# Altium footprint library Universal components.PcbLib: 101 footprints (part 2 of 7)
Each footprint in its own frame and in the unit in brackets; x right, y up, seen from the top. Pads: shape width x height; smd on the part's side, far side on the other; paste and mask are expansions set on the pad; w line width, h text height; cw(c..) or ccw(c..) is an arc to the next point about the centre after c.
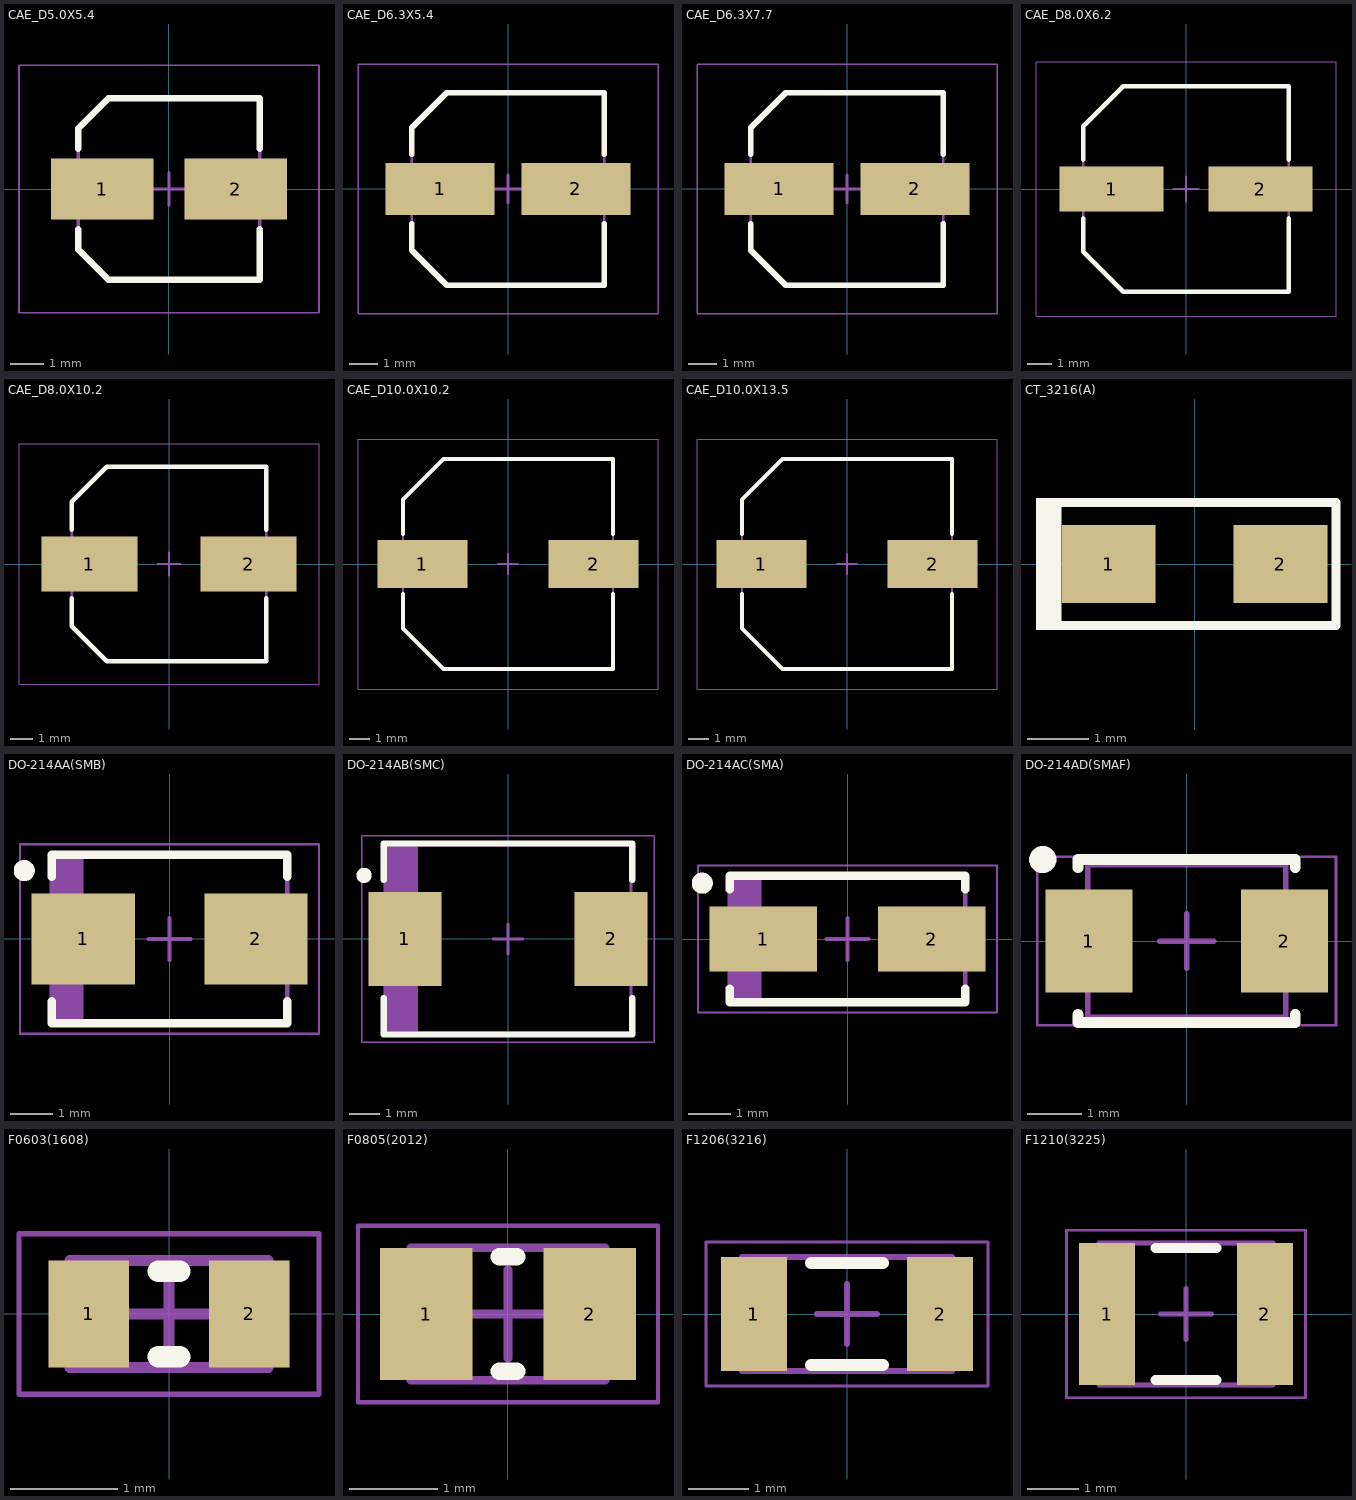
[diagram p1: the footprints below, top view; thin cyan lines are the x and y axes]

## CAE_D5.0X5.4 [mm] "Aluminum Electrolytic Capacitor, Body 5.30x5.30x5.60mm, IPC Low Density"
height 5.6
pads (2):
  rect 3.1x1.85 smd: 1(-2.025,0) 2(2.025,0)
Top Overlay:
  lines w0.2: -2.75,-1.225 -2.75,-1.837 -1.837,-2.75 2.75,-2.75 2.75,-1.225 ; -2.75,1.225 -2.75,1.837 -1.837,2.75 2.75,2.75 2.75,1.225
Mechanical 13:
  lines w0.1: -2.75,-1.837 -2.75,1.837 -1.837,2.75 2.75,2.75 2.75,-2.75 -1.837,-2.75 -2.75,-1.837
Mechanical 15:
  lines w0.05: -4.55,-3.75 4.55,-3.75 4.55,3.75 -4.55,3.75 -4.55,-3.75
  lines w0.1: -0.5,0 0.5,0 ; 0,-0.5 0,0.5
3D body "CAPAE-D5.0x5.4.stp": height 5.5, standoff 0, extent -3.25,-2.75 3.25,2.75

## CAE_D6.3X5.4 [mm] "Aluminum Electrolytic Capacitor, Body 6.60x6.60x5.70mm, IPC Low Density"
height 5.7
pads (2):
  rect 3.85x1.85 smd: 1(-2.4,0) 2(2.4,0)
Top Overlay:
  lines w0.2: -3.4,-1.225 -3.4,-2.163 -2.163,-3.4 3.4,-3.4 3.4,-1.225 ; -3.4,1.225 -3.4,2.163 -2.163,3.4 3.4,3.4 3.4,1.225
Mechanical 13:
  lines w0.1: -3.4,-2.163 -3.4,2.163 -2.163,3.4 3.4,3.4 3.4,-3.4 -2.163,-3.4 -3.4,-2.163
Mechanical 15:
  lines w0.05: -5.3,-4.4 5.3,-4.4 5.3,4.4 -5.3,4.4 -5.3,-4.4
  lines w0.1: -0.5,0 0.5,0 ; 0,-0.5 0,0.5
3D body "CAPAE-D6.3x5.4.stp": height 5.5, standoff 0, extent -3.9,-3.4 3.9,3.4

## CAE_D6.3X7.7 [mm] "Aluminum Electrolytic Capacitor, Body 6.60x6.60x7.90mm, IPC Low Density"
height 7.9
pads (2):
  rect 3.85x1.85 smd: 1(-2.4,0) 2(2.4,0)
Top Overlay:
  lines w0.2: -3.4,-1.225 -3.4,-2.163 -2.163,-3.4 3.4,-3.4 3.4,-1.225 ; -3.4,1.225 -3.4,2.163 -2.163,3.4 3.4,3.4 3.4,1.225
Mechanical 13:
  lines w0.1: -3.4,-2.163 -3.4,2.163 -2.163,3.4 3.4,3.4 3.4,-3.4 -2.163,-3.4 -3.4,-2.163
Mechanical 15:
  lines w0.05: -5.3,-4.4 5.3,-4.4 5.3,4.4 -5.3,4.4 -5.3,-4.4
  lines w0.1: -0.5,0 0.5,0 ; 0,-0.5 0,0.5
3D body "User Library-CC0607 D6.3X7.7.step": height 8.11, standoff 0, extent -3.5,-3.3 3.5,3.3

## CAE_D8.0X6.2 [mm] "Aluminum Electrolytic Capacitor, Body 8.30x8.30x6.40mm, IPC Low Density"
height 6.4
pads (2):
  rect 4.3x1.85 smd: 1(-3.075,0) 2(3.075,0)
Top Overlay:
  lines w0.2: -4.25,-1.225 -4.25,-2.588 -2.588,-4.25 4.25,-4.25 4.25,-1.225 ; -4.25,1.225 -4.25,2.588 -2.588,4.25 4.25,4.25 4.25,1.225
Mechanical 13:
  lines w0.1: -4.25,-2.588 -2.588,-4.25 4.25,-4.25 4.25,4.25 -2.588,4.25 -4.25,2.588 -4.25,-2.588
Mechanical 15:
  lines w0.05: -6.2,-5.25 -6.2,5.25 6.2,5.25 6.2,-5.25 -6.2,-5.25
  lines w0.1: -0.5,0 0.5,0 ; 0,-0.5 0,0.5
3D body "CAPAE-D8.0x6.2.stp": height 6.5, standoff 0, extent -4.75,-4.25 4.75,4.25

## CAE_D8.0X10.2 [mm] "Aluminum Electrolytic Capacitor, Body 8.30x8.30x11.00mm, IPC Low Density"
height 11
pads (2):
  rect 4.2x2.4 smd: 1(-3.475,0) 2(3.475,0)
Top Overlay:
  lines w0.2: -4.25,-1.5 -4.25,-2.725 -2.725,-4.25 4.25,-4.25 4.25,-1.5 ; -4.25,1.5 -4.25,2.725 -2.725,4.25 4.25,4.25 4.25,1.5
Mechanical 13:
  lines w0.1: -4.25,-2.725 -2.725,-4.25 4.25,-4.25 4.25,4.25 -2.725,4.25 -4.25,2.725 -4.25,-2.725
Mechanical 15:
  lines w0.05: -6.55,-5.25 -6.55,5.25 6.55,5.25 6.55,-5.25 -6.55,-5.25
  lines w0.1: -0.5,0 0.5,0 ; 0,-0.5 0,0.5
3D body "CAPAE-D8.0x10.2.stp": height 10.5, standoff 0, extent -5,-4.25 5,4.25

## CAE_D10.0X10.2 [mm] "Aluminum Electrolytic Capacitor, Body 10.30x10.30x11.00mm, IPC Low Density"
height 11
pads (2):
  rect 4.5x2.4 smd: 1(-4.275,0) 2(4.275,0)
Top Overlay:
  lines w0.2: -5.25,-1.5 -5.25,-3.225 -3.225,-5.25 5.25,-5.25 5.25,-1.5 ; -5.25,1.5 -5.25,3.225 -3.225,5.25 5.25,5.25 5.25,1.5
Mechanical 13:
  lines w0.1: -5.25,-3.225 -5.25,3.225 -3.225,5.25 5.25,5.25 5.25,-5.25 -3.225,-5.25 -5.25,-3.225
Mechanical 15:
  lines w0.05: -7.5,-6.25 7.5,-6.25 7.5,6.25 -7.5,6.25 -7.5,-6.25
  lines w0.1: -0.5,0 0.5,0 ; 0,-0.5 0,0.5
3D body "CAPAE-D10.0x10.2.stp": height 10.5, standoff 0, extent -6,-5.25 6,5.25

## CAE_D10.0X13.5 [mm] "Aluminum Electrolytic Capacitor, Body 10.30x10.30x14.50mm, IPC Low Density"
height 14.5
pads (2):
  rect 4.5x2.4 smd: 1(-4.275,0) 2(4.275,0)
Top Overlay:
  lines w0.2: -5.25,-1.5 -5.25,-3.225 -3.225,-5.25 5.25,-5.25 5.25,-1.5 ; -5.25,1.5 -5.25,3.225 -3.225,5.25 5.25,5.25 5.25,1.5
Mechanical 13:
  lines w0.1: -5.25,-3.225 -3.225,-5.25 5.25,-5.25 5.25,5.25 -3.225,5.25 -5.25,3.225 -5.25,-3.225
Mechanical 15:
  lines w0.05: -7.5,-6.25 -7.5,6.25 7.5,6.25 7.5,-6.25 -7.5,-6.25
  lines w0.1: -0.5,0 0.5,0 ; 0,-0.5 0,0.5
3D body "User Library-CL_series_size10x13,5.step": height 13.5, standoff 0, extent -5.45,-5.15 5.45,5.15

## CT_3216(A) [mil]
pads (2):
  rect 60x50 smd: 1(-55,0) 2(55,0)
Top Overlay:
  region: -85.11,42.32 -101.57,42.32 -101.57,-42.32 -85.11,-42.32
  lines w5.91: -90.55,-39.37 90.55,-39.37 90.55,39.37 -90.55,39.37
3D body "User Library-CAP_TANT_3216-18_A_case.SLDPRT": height 70.87, standoff 0, extent -66.93,-35.43 66.93,35.43

## DO-214AA(SMB) [mm] "Molded Diode, 2-Leads, Body 5.29x3.62mm, IPC Medium Density"
height 2.5
pads (2):
  rect 2.45x2.15 smd: 1(-2.05,0) 2(2.05,0)
Top Overlay:
  circle w0.25: c-3.45,1.625 r0.125
  lines w0.2: -2.8,-1.475 -2.8,-2 2.8,-2 2.8,-1.475 ; -2.8,1.475 -2.8,2 2.8,2 2.8,1.475
Mechanical 13:
  rectangle: -2.795,-1.97 -2.043,1.97
  lines w0.1: -2.795,-1.97 2.795,-1.97 2.795,1.97 -2.795,1.97 -2.795,-1.97
Mechanical 15:
  lines w0.05: -3.55,-2.25 3.55,-2.25 3.55,2.25 -3.55,2.25 -3.55,-2.25
  lines w0.1: -0.5,0 0.5,0 ; 0,-0.5 0,0.5
3D body "User Library-DIOM5539X24.step": height 2.45, standoff 0.03, extent -2.75,-1.95 2.75,1.95

## DO-214AB(SMC) [mm] "Molded Diode, 2-Leads, Body 7.94x5.90mm, IPC Medium Density"
height 2.5
pads (2):
  rect 2.4x3.1 smd: 1(-3.4,0) 2(3.4,0)
Top Overlay:
  circle w0.25: c-4.75,2.1 r0.125
  lines w0.2: -4.1,-1.95 -4.1,-3.15 4.1,-3.15 4.1,-1.95 ; -4.1,1.95 -4.1,3.15 4.1,3.15 4.1,1.95
Mechanical 13:
  rectangle: -4.065,-3.11 -2.972,3.11
  lines w0.1: -4.065,-3.11 4.065,-3.11 4.065,3.11 -4.065,3.11 -4.065,-3.11
Mechanical 15:
  lines w0.05: -4.825,-3.4 4.825,-3.4 4.825,3.4 -4.825,3.4 -4.825,-3.4
  lines w0.1: -0.5,0 0.5,0 ; 0,-0.5 0,0.5
3D body "User Library-DIOM8261X24.step": height 2.4, standoff 0.03, extent -4.065,-3.05 4.065,3.05

## DO-214AC(SMA) [mm] "Molded Diode, 2-Leads, Body 5.19x2.60mm, IPC Medium Density"
height 2.3
pads (2):
  rect 2.55x1.55 smd: 1(-2,0) 2(2,0)
Top Overlay:
  circle w0.25: c-3.45,1.325 r0.125
  lines w0.2: -2.8,-1.175 -2.8,-1.5 2.8,-1.5 2.8,-1.175 ; -2.8,1.175 -2.8,1.5 2.8,1.5 2.8,1.175
Mechanical 13:
  rectangle: -2.795,-1.46 -2.043,1.46
  lines w0.1: -2.795,-1.46 -2.795,1.46 2.795,1.46 2.795,-1.46 -2.795,-1.46
Mechanical 15:
  lines w0.05: -3.55,-1.75 -3.55,1.75 3.55,1.75 3.55,-1.75 -3.55,-1.75
  lines w0.1: -0.5,0 0.5,0 ; 0,-0.5 0,0.5
3D body "User Library-DIOM5528X26.step": height 2.6, standoff 0.03, extent -2.75,-1.4 2.75,1.4

## DO-214AD(SMAF) [mm] "SODFL, 2-Leads, Body 2.60x4.60mm, IPC Medium Density"
height 1.4
pads (2):
  rect 1.6x1.9 smd: 1(-1.8,0) 2(1.8,0)
Top Overlay:
  circle w0.25: c-2.65,1.5 r0.125
  lines w0.2: -2,-1.35 -2,-1.5 2,-1.5 2,-1.35 ; -2,1.35 -2,1.5 2,1.5 2,1.35
Mechanical 13:
  lines w0.1: -1.825,-1.4 -1.825,1.4 1.825,1.4 1.825,-1.4 -1.825,-1.4
Mechanical 15:
  lines w0.05: -2.75,-1.55 -2.75,1.55 2.75,1.55 2.75,-1.55 -2.75,-1.55
  lines w0.1: -0.5,0 0.5,0 ; 0,-0.5 0,0.5
3D body "User Library-DO-214AD.step": height 1, standoff 0, extent -2.35,-1.25 2.35,1.25

## F0603(1608) [mm] "Chip Fuse, 2-Leads, Body 1.65x0.80mm, IPC Medium Density"
height 0.75
pads (2):
  rect 0.75x1 smd: 1(-0.75,0) 2(0.75,0)
Top Overlay:
  lines w0.2: -0.1,-0.4 0.1,-0.4 ; -0.1,0.4 0.1,0.4
Mechanical 13:
  lines w0.1: -0.925,-0.5 0.925,-0.5 0.925,0.5 -0.925,0.5 -0.925,-0.5
Mechanical 15:
  lines w0.05: -1.4,-0.75 1.4,-0.75 1.4,0.75 -1.4,0.75 -1.4,-0.75
  lines w0.1: -0.5,0 0.5,0 ; 0,-0.5 0,0.5
3D body "User Library-ptc06032-1.step": height 0.75, standoff 0, extent -0.8,-0.375 0.8,0.375

## F0805(2012) [mm] "Chip Fuse, 2-Leads, Body 2.10x1.35mm, IPC Medium Density"
height 1.2
pads (2):
  rect 1.05x1.5 smd: 1(-0.925,0) 2(0.925,0)
Top Overlay:
  lines w0.2: -0.1,-0.65 0.1,-0.65 ; -0.1,0.65 0.1,0.65
Mechanical 13:
  lines w0.1: -1.1,-0.75 1.1,-0.75 1.1,0.75 -1.1,0.75 -1.1,-0.75
Mechanical 15:
  lines w0.05: -1.7,-1 1.7,-1 1.7,1 -1.7,1 -1.7,-1
  lines w0.1: -0.5,0 0.5,0 ; 0,-0.5 0,0.5
3D body "User Library-fuse0805L050WR.step": height 1.24, standoff 0, extent -1.105,-0.749 1.105,0.749

## F1206(3216) [mm] "Chip Fuse, 2-Leads, Body 3.25x1.70mm, IPC Medium Density"
height 1.2
pads (2):
  rect 1.1x1.9 smd: 1(-1.55,0) 2(1.55,0)
Top Overlay:
  lines w0.2: -0.6,-0.85 0.6,-0.85 ; -0.6,0.85 0.6,0.85
Mechanical 13:
  lines w0.1: -1.75,-0.95 -1.75,0.95 1.75,0.95 1.75,-0.95 -1.75,-0.95
Mechanical 15:
  lines w0.05: -2.35,-1.2 -2.35,1.2 2.35,1.2 2.35,-1.2 -2.35,-1.2
  lines w0.1: -0.5,0 0.5,0 ; 0,-0.5 0,0.5
3D body "User Library-Litttlefuse 1206.step": height 1.45, standoff -0.01, extent -1.601,-0.826 1.601,0.826

## F1210(3225) [mm] "Chip Fuse, 2-Leads, Body 3.22x2.57mm, IPC Medium Density"
height 1.2
pads (2):
  rect 1.1x2.8 smd: 1(-1.55,0) 2(1.55,0)
Top Overlay:
  lines w0.2: -0.6,-1.3 0.6,-1.3 ; -0.6,1.3 0.6,1.3
Mechanical 13:
  lines w0.1: -1.715,-1.4 -1.715,1.4 1.715,1.4 1.715,-1.4 -1.715,-1.4
Mechanical 15:
  lines w0.05: -2.35,-1.65 -2.35,1.65 2.35,1.65 2.35,-1.65 -2.35,-1.65
  lines w0.1: -0.5,0 0.5,0 ; 0,-0.5 0,0.5
3D body "User Library-Fuse1210.step": height 0.67, standoff 0, extent -1.607,-1.287 1.608,1.288